# Altium footprint library Cyberdeck.PcbLib: 261 footprints (part 9 of 17)
Each footprint in its own frame and in the unit in brackets; x right, y up, seen from the top. Pads: shape width x height; smd on the part's side, far side on the other; paste and mask are expansions set on the pad; w line width, h text height; cw(c..) or ccw(c..) is an arc to the next point about the centre after c.
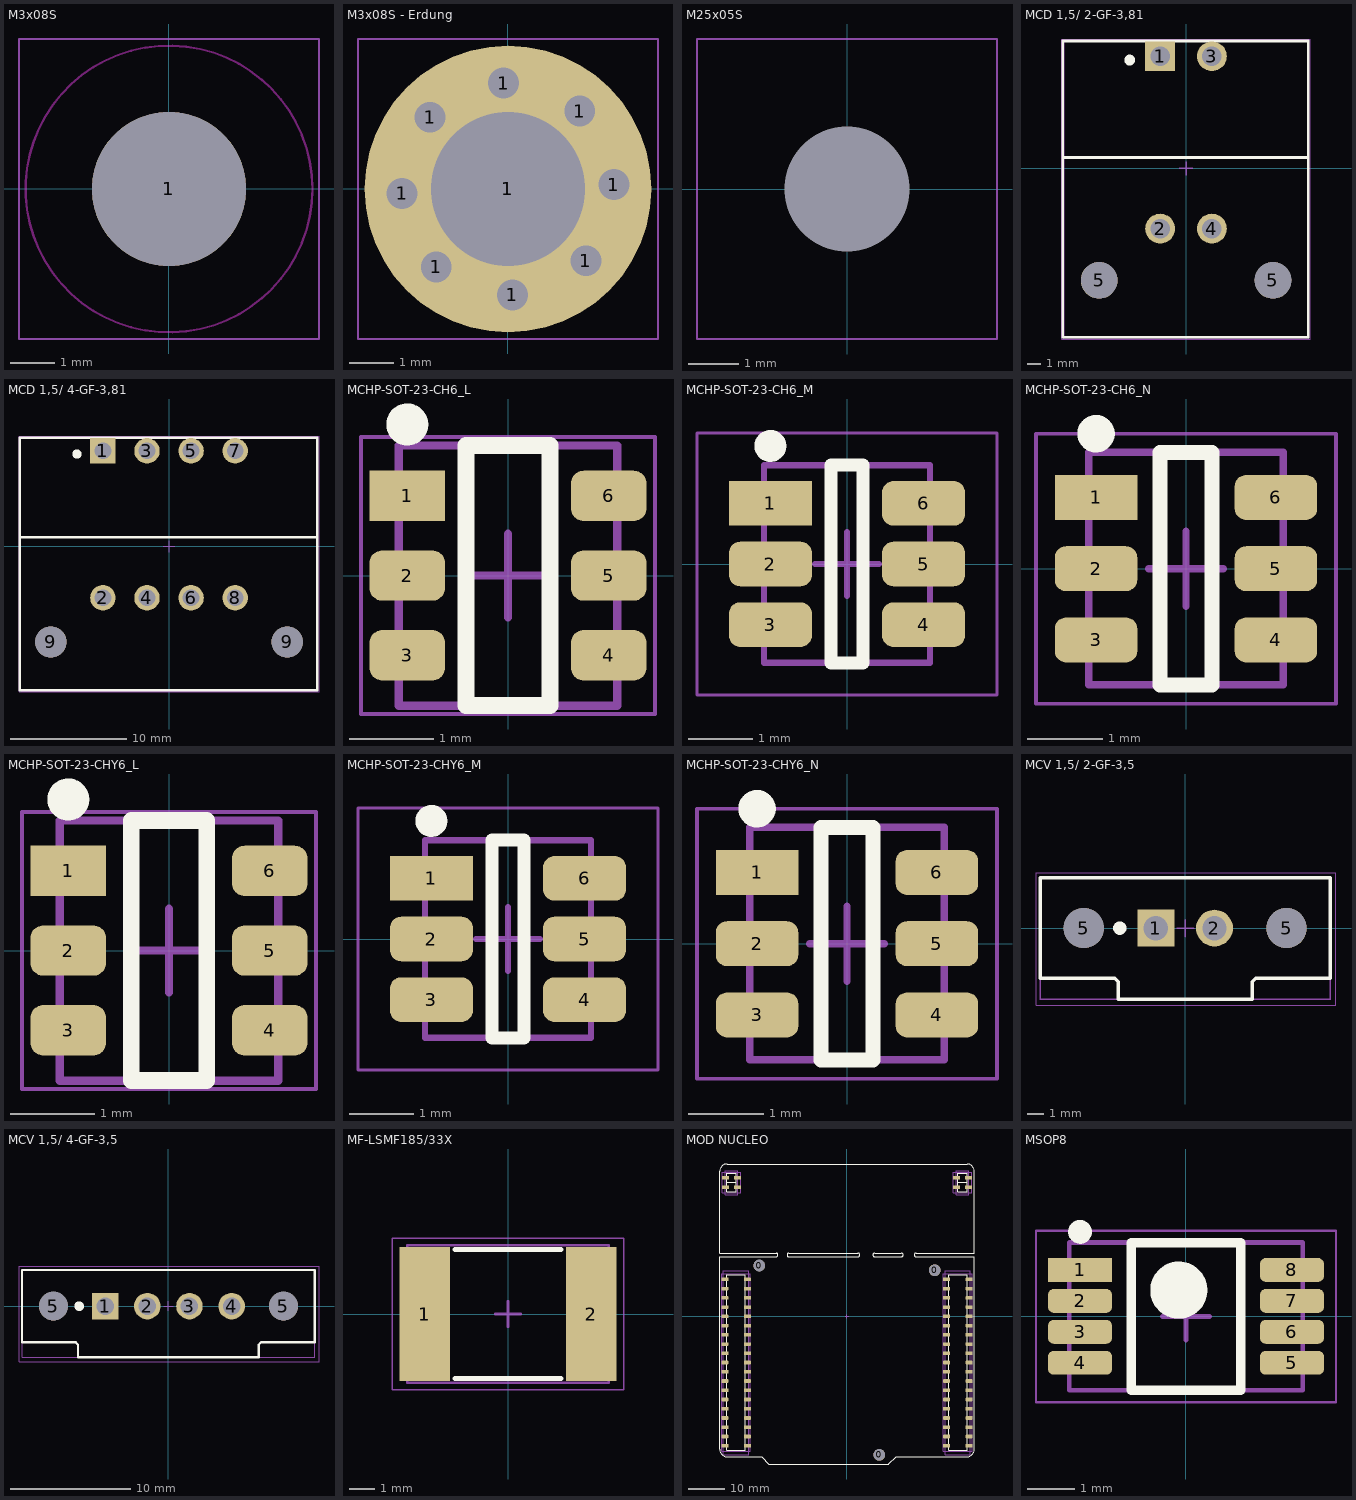
[diagram p8: the footprints below, top view; thin cyan lines are the x and y axes]

## M3x08S [mm]
pads (1):
  round 3.5 hole 3.5 unplated: 1(0,0)
Keep-Out Layer:
  circle w0.05: c0,0 r3.25
Courtyard Top:
  lines w0.05: -3.4,-3.4 3.4,-3.4 3.4,3.4 -3.4,3.4 -3.4,-3.4
  lines w0.1: -0.5,0 0.5,0 ; 0,-0.5 0,0.5

## M3x08S - Erdung [mm]
pads (9):
  round 1.524 hole 0.7: 1(-2.4,-0.1) 1(-1.768,1.626) 1(-1.626,-1.768) 1(-0.1,2.4) 1(0.1,-2.4) 1(1.626,1.768) 1(1.768,-1.626) 1(2.4,0.1)
  round 6.5 hole 3.5: 1(0,0)
Courtyard Top:
  lines w0.05: -3.4,-3.4 -3.4,3.4 3.4,3.4 3.4,-3.4 -3.4,-3.4
  lines w0.1: -0.5,0 0.5,0 ; 0,-0.5 0,0.5

## M25x05S [mm]
height 2
pads (1):
  round 0 hole 2.5 unplated paste+0 mask+2.8: 15(0,0)
Courtyard Top:
  lines w0.05: -3,-3 3,-3 3,3 -3,3 -3,-3
  lines w0.1: -0.5,0 0.5,0 ; 0,-0.5 0,0.5

## MCD 1,5/ 2-GF-3,81 [mm] "MCD 1,5/ 2-GF-3,81"
height 22.7
pads (6):
  rect 2.2x2.2 hole 1.45: 1(-1.905,8.255)
  round 2.2 hole 1.45: 2(-1.905,-4.445) 3(1.905,8.255) 4(1.905,-4.445)
  round 2.7 hole 2.7 unplated: 5(-6.405,-8.255) 5(6.405,-8.255)
Top Overlay:
  circle w0.5: c-4.15,7.975 r0.15
  lines w0.2: -9.025,0.8 8.975,0.8 ; -9.08,-12.445 -9.08,9.38 8.995,9.38 8.995,-12.445 -9.08,-12.445
Assembly Top:
  lines w0.1: -9.005,-12.47 -9.005,9.43 9.02,9.43 9.02,-12.47 -9.005,-12.47
Courtyard Top:
  lines w0.05: -9.155,-12.575 9.15,-12.575 9.15,9.525 -9.155,9.525 -9.155,-12.575
  lines w0.1: -0.5,0 0.5,0 ; 0,-0.5 0,0.5
3D body "1830101_03.stp": height 22.71, standoff -3.49, extent -9.005,-12.445 9.005,9.455

## MCD 1,5/ 4-GF-3,81 [mm] "MCD 1,5/ 4-GF-3,81"
height 22.7
pads (10):
  rect 2.2x2.2 hole 1.45: 1(-5.715,8.255)
  round 2.2 hole 1.45: 2(-5.715,-4.445) 3(-1.905,8.255) 4(-1.905,-4.445) 5(1.905,8.255) 6(1.905,-4.445) 7(5.715,8.255) 8(5.715,-4.445)
  round 2.7 hole 2.7 unplated: 9(-10.215,-8.255) 9(10.215,-8.255)
Top Overlay:
  circle w0.5: c-7.96,7.975 r0.15
  lines w0.2: -12.835,0.8 12.765,0.8 ; -12.89,-12.445 -12.89,9.38 12.805,9.38 12.805,-12.445 -12.89,-12.445
Assembly Top:
  lines w0.1: 12.815,-12.47 -12.815,-12.47 -12.815,9.43 12.83,9.43 12.83,-12.47
Courtyard Top:
  lines w0.05: -12.965,-12.575 12.96,-12.575 12.96,9.525 -12.965,9.525 -12.965,-12.575
  lines w0.1: -0.5,0 0.5,0 ; 0,-0.5 0,0.5
3D body "1830127_03.stp": height 22.71, standoff -3.49, extent -12.815,-12.445 12.815,9.455

## MCHP-SOT-23-CH6_L [mm] "SOT23, 6-Leads, Body 2.9x1.55mm, Pitch 0.95mm, IPC High Density"
height 1.45
pads (6):
  rect 0.9x0.6 smd: 1(-1.2,0.95)
  rrect50% 0.9x0.6 smd: 2(-1.2,0) 3(-1.2,-0.95) 4(1.2,-0.95) 5(1.2,0) 6(1.2,0.95)
Top Overlay:
  circle w0.25: c-1.2,1.8 r0.125
  lines w0.2: -0.5,-1.55 -0.5,1.55 0.5,1.55 0.5,-1.55 -0.5,-1.55
Assembly Top:
  lines w0.1: -1.3,-1.55 -0.9,-1.55 1.3,-1.55 1.3,1.55 -0.9,1.55 -1.3,1.55 -1.3,-1.55
Courtyard Top:
  lines w0.05: -1.75,-1.65 1.75,-1.65 1.75,1.65 -1.75,1.65 -1.75,-1.65
  lines w0.1: -0.5,0 0.5,0 ; 0,-0.5 0,0.5
3D body "SOT95P245X110-6N.step": height 1.1, standoff 0, extent -1.3,-1.5 1.3,1.5

## MCHP-SOT-23-CH6_M [mm] "SOT23, 6-Leads, Body 2.9x1.55mm, Pitch 0.95mm, IPC Low Density"
height 1.45
pads (6):
  rect 1.3x0.7 smd: 1(-1.2,0.95)
  rrect50% 1.3x0.7 smd: 2(-1.2,0) 3(-1.2,-0.95) 4(1.2,-0.95) 5(1.2,0) 6(1.2,0.95)
Top Overlay:
  circle w0.25: c-1.2,1.85 r0.125
  lines w0.2: -0.25,-1.55 0.25,-1.55 0.25,1.55 -0.25,1.55 -0.25,-1.55
Assembly Top:
  lines w0.1: -1.3,-1.55 -1.3,1.55 1.3,1.55 1.3,-1.55 -1.3,-1.55
Courtyard Top:
  lines w0.05: -2.35,-2.05 -2.35,2.05 2.35,2.05 2.35,-2.05 -2.35,-2.05
  lines w0.1: -0.5,0 0.5,0 ; 0,-0.5 0,0.5
3D body "SOT95P245X110-6N.step": height 1.1, standoff 0, extent -1.3,-1.5 1.3,1.5

## MCHP-SOT-23-CH6_N [mm] "SOT23, 6-Leads, Body 2.9x1.55mm, Pitch 0.95mm, IPC Medium Density"
height 1.45
pads (6):
  rect 1.1x0.6 smd: 1(-1.2,0.95)
  rrect50% 1.1x0.6 smd: 2(-1.2,0) 3(-1.2,-0.95) 4(1.2,-0.95) 5(1.2,0) 6(1.2,0.95)
Top Overlay:
  circle w0.25: c-1.2,1.8 r0.125
  lines w0.2: -0.35,-1.55 0.35,-1.55 0.35,1.55 -0.35,1.55 -0.35,-1.55
Assembly Top:
  lines w0.1: -1.3,-1.55 -1.3,1.55 1.3,1.55 1.3,-1.55 -1.3,-1.55
Courtyard Top:
  lines w0.05: -2,-1.8 -2,1.8 2,1.8 2,-1.8 -2,-1.8
  lines w0.1: -0.5,0 0.5,0 ; 0,-0.5 0,0.5
3D body "SOT95P245X110-6N.step": height 1.1, standoff 0, extent -1.3,-1.5 1.3,1.5

## MCHP-SOT-23-CHY6_L [mm] "SOT23, 6-Leads, Body 2.9x1.55mm, Pitch 0.95mm, IPC High Density"
height 1.45
pads (6):
  rect 0.9x0.6 smd: 1(-1.2,0.95)
  rrect50% 0.9x0.6 smd: 2(-1.2,0) 3(-1.2,-0.95) 4(1.2,-0.95) 5(1.2,0) 6(1.2,0.95)
Top Overlay:
  circle w0.25: c-1.2,1.8 r0.125
  lines w0.2: -0.45,-1.55 0.45,-1.55 0.45,1.55 -0.45,1.55 -0.45,-1.55
Assembly Top:
  lines w0.1: -1.3,-1.55 -1.3,1.55 1.3,1.55 1.3,-1.55 -1.3,-1.55
Courtyard Top:
  lines w0.05: -1.75,-1.65 -1.75,1.65 1.75,1.65 1.75,-1.65 -1.75,-1.65
  lines w0.1: -0.5,0 0.5,0 ; 0,-0.5 0,0.5
3D body "SOT95P245X110-6N.step": height 1.1, standoff 0, extent -1.3,-1.5 1.3,1.5

## MCHP-SOT-23-CHY6_M [mm] "SOT23, 6-Leads, Body 2.9x1.55mm, Pitch 0.95mm, IPC Low Density"
height 1.45
pads (6):
  rect 1.3x0.7 smd: 1(-1.2,0.95)
  rrect50% 1.3x0.7 smd: 2(-1.2,0) 3(-1.2,-0.95) 4(1.2,-0.95) 5(1.2,0) 6(1.2,0.95)
Top Overlay:
  circle w0.25: c-1.2,1.85 r0.125
  lines w0.2: -0.25,-1.55 0.25,-1.55 0.25,1.55 -0.25,1.55 -0.25,-1.55
Assembly Top:
  lines w0.1: -1.3,-1.55 -1.3,1.55 1.3,1.55 1.3,-1.55 -1.3,-1.55
Courtyard Top:
  lines w0.05: -2.35,-2.05 -2.35,2.05 2.35,2.05 2.35,-2.05 -2.35,-2.05
  lines w0.1: -0.5,0 0.5,0 ; 0,-0.5 0,0.5
3D body "SOT95P245X110-6N.step": height 1.1, standoff 0, extent -1.3,-1.5 1.3,1.5

## MCHP-SOT-23-CHY6_N [mm] "SOT23, 6-Leads, Body 2.9x1.55mm, Pitch 0.95mm, IPC Medium Density"
height 1.45
pads (6):
  rect 1.1x0.6 smd: 1(-1.2,0.95)
  rrect50% 1.1x0.6 smd: 2(-1.2,0) 3(-1.2,-0.95) 4(1.2,-0.95) 5(1.2,0) 6(1.2,0.95)
Top Overlay:
  circle w0.25: c-1.2,1.8 r0.125
  lines w0.2: -0.35,-1.55 0.35,-1.55 0.35,1.55 -0.35,1.55 -0.35,-1.55
Assembly Top:
  lines w0.1: -1.3,-1.55 -1.3,1.55 1.3,1.55 1.3,-1.55 -1.3,-1.55
Courtyard Top:
  lines w0.05: -2,-1.8 -2,1.8 2,1.8 2,-1.8 -2,-1.8
  lines w0.1: -0.5,0 0.5,0 ; 0,-0.5 0,0.5
3D body "SOT95P245X110-6N.step": height 1.1, standoff 0, extent -1.3,-1.5 1.3,1.5

## MCV 1,5/ 2-GF-3,5 [mm] "MCV 1,5/ 2-GF-3,5"
height 9.2
pads (4):
  rect 2.2x2.2 hole 1.45: 1(-1.75,0)
  round 2.2 hole 1.45: 2(1.75,0)
  round 2.4 hole 2.4 unplated: 5(-6.05,0) 5(6.05,0)
Top Overlay:
  circle w0.5: c-3.9,0 r0.15
  lines w0.2: 4,-4.25 -4,-4.25 -4,-3.2 -4.2,-3 -8.65,-3 -8.65,3 8.65,3 8.65,-3 4.2,-3 4,-3.2 4,-4.25 ; 4,-4.25 4,-4.25
Assembly Top:
  lines w0.1: -8.65,-4.25 -8.65,-4.25 ; -8.65,-4.25 -8.65,3 8.65,3 8.65,-4.25 ; -8.65,-4.25 8.65,-4.25 ; 8.65,-4.25 8.65,-4.25
Courtyard Top:
  lines w0.05: -8.9,-4.6 9,-4.6 9,3.3 -8.9,3.3 -8.9,-4.6
  lines w0.1: -0.5,0 0.5,0 ; 0,-0.5 0,0.5
3D body "pxc_1843224_05_MCV-1-5-2-GF-3-5_3D.stp": height 9.21, standoff -3.39, extent -8.675,-4.25 8.625,3

## MCV 1,5/ 4-GF-3,5 [mm] "EMC 1,5/ 4-GF-3,5"
height 9.2
pads (6):
  rect 2.2x2.2 hole 1.45: 1(-5.25,0)
  round 2.2 hole 1.45: 2(-1.75,0) 3(1.75,0) 4(5.25,0)
  round 2.4 hole 2.4 unplated: 5(-9.55,0) 5(9.55,0)
Top Overlay:
  circle w0.5: c-7.4,0 r0.15
  lines w0.2: -12.15,-3 -7.7,-3 -7.5,-3.2 -7.5,-4.25 7.5,-4.25 7.5,-3.2 7.7,-3 12.15,-3 12.15,3 -12.15,3 -12.15,-3
Assembly Top:
  lines w0.1: -12.15,-4.25 12.15,-4.25 ; -12.15,-4.25 -12.15,-4.25 ; -12.15,-4.25 -12.15,3 12.15,3 12.15,-4.25 ; 12.15,-4.25 12.15,-4.25
Courtyard Top:
  lines w0.05: -12.4,-4.6 12.5,-4.6 12.5,3.3 -12.4,3.3 -12.4,-4.6
  lines w0.1: -0.4,0 0.4,0 ; 0,-0.4 0,0.4
3D body "1843240_05.stp": height 9.21, standoff -3.39, extent -12.15,-4.25 12.15,3

## MF-LSMF185/33X [mm] "MF-LSMF185/33X"
height 1.6
pads (2):
  rect 2x5.3 smd: 1(-3.3,0) 2(3.3,0)
Top Overlay:
  lines w0.2: -2.1,-2.55 2.1,-2.55 ; -2.1,2.55 2.1,2.55
Assembly Top:
  lines w0.1: -3.99,-2.72 3.99,-2.72 3.99,2.72 -3.99,2.72 -3.99,-2.72
Courtyard Top:
  lines w0.05: -4.6,-3 4.6,-3 4.6,3 -4.6,3 -4.6,-3
  lines w0.1: -0.5,0 0.5,0 ; 0,-0.5 0,0.5
3D body: height 1.6, standoff 0, extent 3.69,-2.72 3.99,2.72
3D body: height 1.6, standoff 0, extent -3.99,-2.72 -3.69,2.72
3D body: height 1.6, standoff 0, extent -3.69,-2.72 3.69,2.72

## MOD NUCLEO [mm]
height 25
pads (87):
  round 3.2 hole 3.2 unplated: 0(-24.13,13.97) 0(8.89,-38.1) 0(24.13,12.7)
  rect 2x1 smd: 1(-33.58,10.16) 39(27.38,10.16) 77(-33.4,35.55) 77(-30.1,35.55) 77(30.1,35.55) 77(33.4,35.55)
  rrect50% 2x1 smd: 2(-27.38,10.16) 3(-33.58,7.62) 4(-27.38,7.62) 5(-33.58,5.08) 6(-27.38,5.08) 7(-33.58,2.54) 8(-27.38,2.54) 9(-33.58,0) 10(-27.38,0) 11(-33.58,-2.54) 12(-27.38,-2.54) 13(-33.58,-5.08) 14(-27.38,-5.08) 15(-33.58,-7.62) 16(-27.38,-7.62) 17(-33.58,-10.16) 18(-27.38,-10.16) 19(-33.58,-12.7) 20(-27.38,-12.7) 21(-33.58,-15.24) 22(-27.38,-15.24) 23(-33.58,-17.78) 24(-27.38,-17.78) 25(-33.58,-20.32) 26(-27.38,-20.32) 27(-33.58,-22.86) 28(-27.38,-22.86) 29(-33.58,-25.4) 30(-27.38,-25.4) 31(-33.58,-27.94) 32(-27.38,-27.94) 33(-33.58,-30.48) 34(-27.38,-30.48) 35(-33.58,-33.02) 36(-27.38,-33.02) 37(-33.58,-35.56) 38(-27.38,-35.56) 40(33.58,10.16) 41(27.38,7.62) 42(33.58,7.62) 43(27.38,5.08) 44(33.58,5.08) 45(27.38,2.54) 46(33.58,2.54) 47(27.38,0) 48(33.58,0) 49(27.38,-2.54) 50(33.58,-2.54) 51(27.38,-5.08) 52(33.58,-5.08) 53(27.38,-7.62) 54(33.58,-7.62) 55(27.38,-10.16) 56(33.58,-10.16) 57(27.38,-12.7) 58(33.58,-12.7) 59(27.38,-15.24) 60(33.58,-15.24) 61(27.38,-17.78) 62(33.58,-17.78) 63(27.38,-20.32) 64(33.58,-20.32) 65(27.38,-22.86) 66(33.58,-22.86) 67(27.38,-25.4) 68(33.58,-25.4) 69(27.38,-27.94) 70(33.58,-27.94) 71(27.38,-30.48) 72(33.58,-30.48) 73(27.38,-33.02) 74(33.58,-33.02) 75(27.38,-35.56) 76(33.58,-35.56) 77(-33.4,38.1) 77(-30.1,38.1) 77(30.1,38.1) 77(33.4,38.1)
Top Overlay:
  circle w0.381: c27.305,10.158 r0.191
  circle w0.381: c-33.655,10.158 r0.191
  lines w0.152: -33.019,36.831 -30.479,36.831 ; 30.481,36.831 33.021,36.831 ; -33.019,34.291 -30.479,34.291 -30.479,39.371 -33.019,39.371 -33.019,34.291 ; 30.481,34.291 30.481,39.371 33.021,39.371 33.021,34.291 30.481,34.291
  lines w0.2: 13.47,-38.6 33,-38.6 ccw(c33,-36.6) 35,-36.6 35,16.4 19,16.4 cw(c19,16.9) 19,17.4 35,17.4 35,39.9 ccw(c33,39.9) 33,41.9 -33,41.9 ccw(c-33,39.9) -35,39.9 -35,17.4 -19.5,17.4 cw(c-19.5,16.9) -19.5,16.4 -35,16.4 -35,-36.6 ccw(c-33,-36.6) -33,-38.6 -23.63,-38.6 -23.5,-38.6 -21.5,-40.6 11.5,-40.6 ; 13.5,-38.6 11.5,-40.6 ; 11.5,-40.6 11.5,-40.6 ; -33.02,-36.83 -33.02,11.43 -27.94,11.43 -27.94,-36.83 -33.02,-36.83 ; -16,16.4 cw(c-16,16.9) -16,17.4 3,17.4 cw(c3,16.9) 3,16.4 -16,16.4 ; 7.62,16.4 cw(c7.62,16.9) 7.62,17.4 14.95,17.4 cw(c14.95,16.9) 14.95,16.4 7.62,16.4 ; 27.94,-36.83 33.02,-36.83 33.02,11.43 27.94,11.43 27.94,-36.83
Assembly Top:
  lines w0.1: -34.425,-37.075 -34.425,11.675 -26.575,11.675 -26.575,-37.075 -34.425,-37.075 ; -34.325,34.025 -34.325,39.6 -29.175,39.6 -29.175,34.025 -34.325,34.025 ; 26.535,-37.075 34.385,-37.075 34.385,11.675 26.535,11.675 26.535,-37.075 ; 29.175,34.025 34.325,34.025 34.325,39.6 29.175,39.6 29.175,34.025
Courtyard Top:
  lines w0.1: -0.5,0 0.5,0 ; 0,-0.5 0,0.5 ; -34,-38 -34,12.5 -28.5,12.5 -27,12.5 -27,-38 -27.1,-38 -34,-38 ; -33.5,33.5 -33.5,40 -30,40 -30,33.5 -33.5,33.5 ; 26.96,-38 26.96,12.5 32.46,12.5 33.96,12.5 33.96,-38 33.86,-38 26.96,-38 ; 30,33.5 30,40 33.5,40 33.5,33.5 30,33.5
3D body: height 8.5, standoff -3, extent 0.5,0 0.5,0
3D body: height 8.5, standoff -3, extent 0,0.5 0,0.5
3D body "SSW-102-22-FM-S-VS-TR.stp": height 9.79, standoff 0.01, extent 29.172,34.031 34.328,39.619
3D body "SSW-102-22-FM-S-VS-TR.stp": height 9.79, standoff 0.01, extent -34.328,34.031 -29.172,39.619
3D body "SSW-119-22-F-D-VS-TR.stp": height 9.79, standoff 0.01, extent 26.523,-37.084 34.397,11.684
3D body "SSW-119-22-F-D-VS-TR.stp": height 9.79, standoff 0.01, extent -34.437,-37.084 -26.563,11.684

## MSOP8 [mm] "S-PDSO-G8, DGK,"
height 1.1
pads (8):
  rect 1.35x0.5 smd: 1(-2.225,0.975)
  rrect50% 1.35x0.5 smd: 2(-2.225,0.325) 3(-2.225,-0.325) 4(-2.225,-0.975) 5(2.225,-0.975) 6(2.225,-0.325) 7(2.225,0.325) 8(2.225,0.975)
Top Overlay:
  circle w0.6: c-0.15,0.55 r0.3
  circle w0.25: c-2.225,1.775 r0.125
  lines w0.2: -1.15,-1.55 1.15,-1.55 1.15,1.55 -1.15,1.55 -1.15,-1.55
Assembly Top:
  lines w0.1: -2.45,-1.55 2.45,-1.55 2.45,1.55 -2.45,1.55 -2.45,-1.55
Courtyard Top:
  lines w0.05: -3.15,-1.8 3.15,-1.8 3.15,1.8 -3.15,1.8 -3.15,-1.8
  lines w0.1: -0.5,0 0.5,0 ; 0,-0.5 0,0.5
3D body "SOP127P600-8N.step": height 1.1, standoff 0, extent -2.45,-1.55 2.45,1.55